# Altium footprint library ACTION标准库.pcblib: 504 footprints (part 5 of 32)
Each footprint in its own frame and in the unit in brackets; x right, y up, seen from the top. Pads: shape width x height; smd on the part's side, far side on the other; paste and mask are expansions set on the pad; w line width, h text height; cw(c..) or ccw(c..) is an arc to the next point about the centre after c.
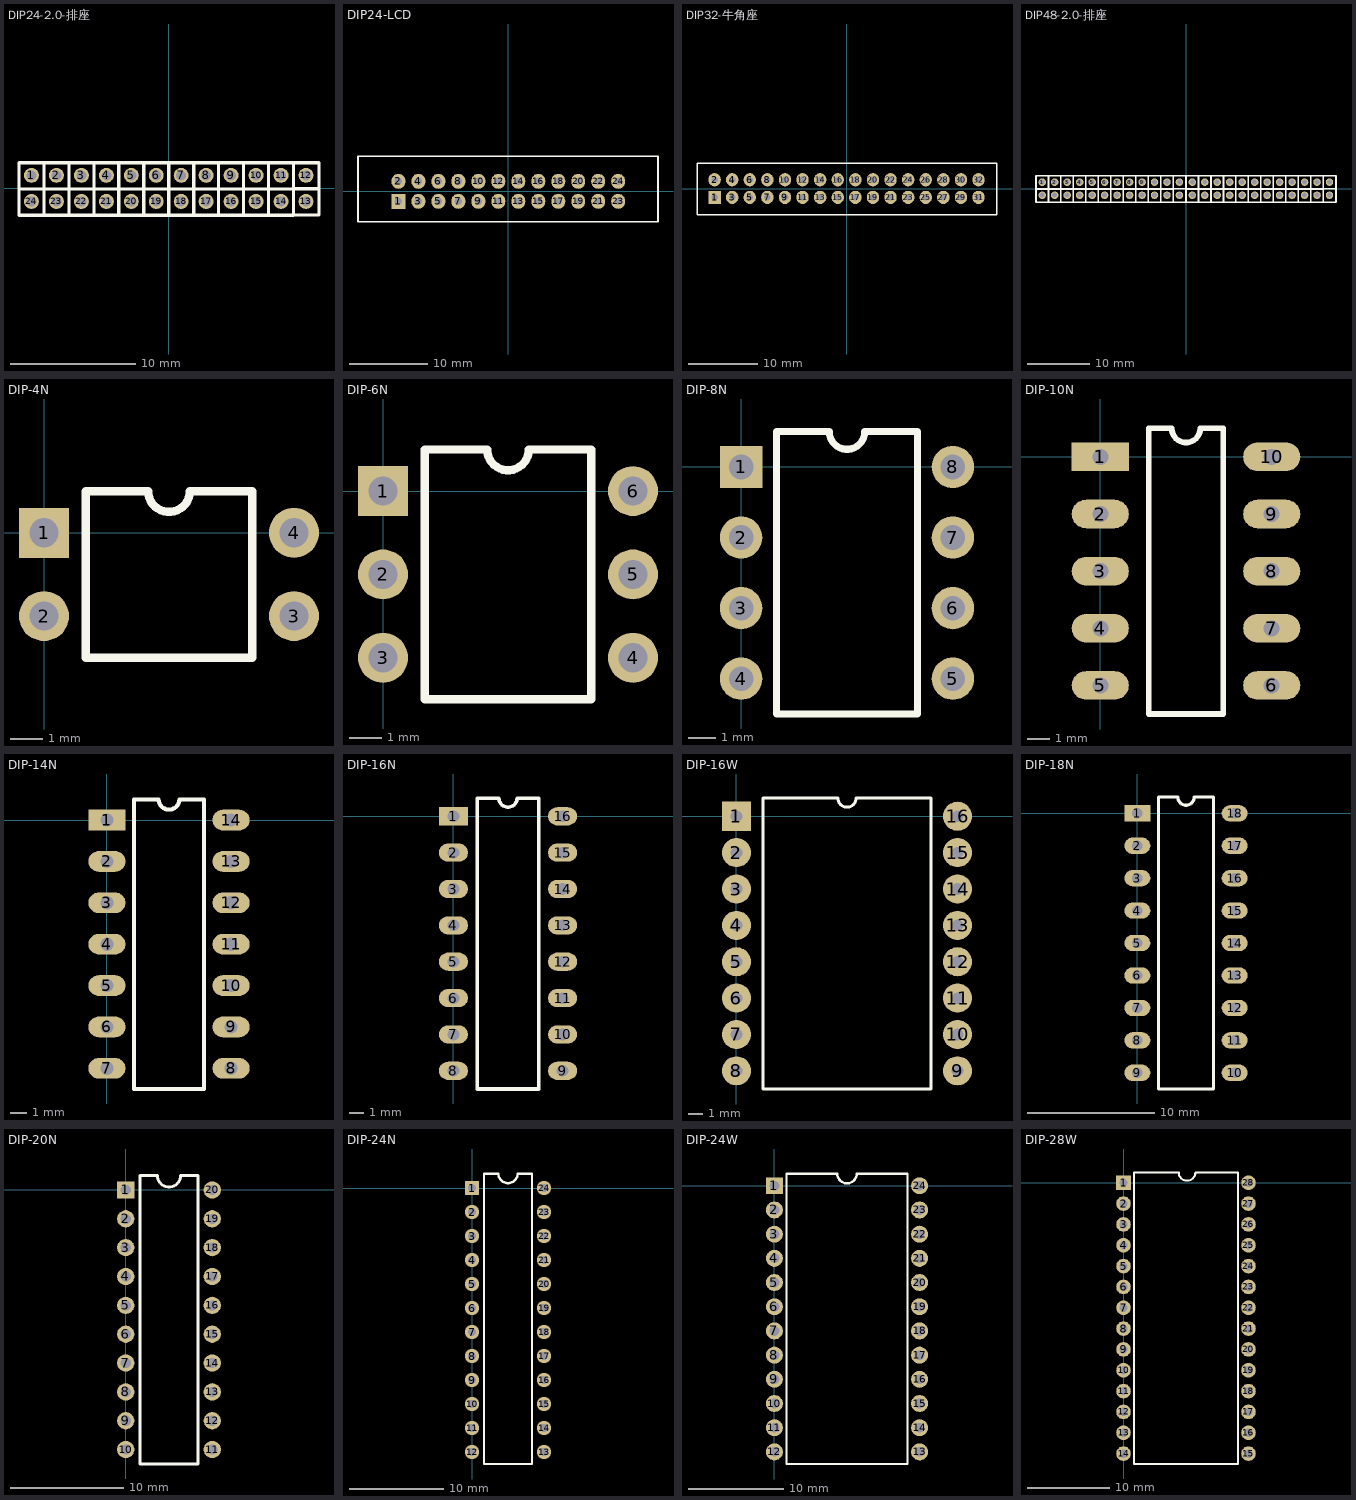
[diagram p4: the footprints below, top view; thin cyan lines are the x and y axes]

## DIP24-2.0-排座 [mm]
pads (24):
  round 1.2 hole 0.8: 1(-11,1.05) 2(-9,1.05) 3(-7,1.05) 4(-5,1.05) 5(-3,1.05) 6(-1,1.05) 7(1,1.05) 8(3,1.05) 9(5,1.05) 10(7,1.05) 11(9,1.05) 12(11,1.05) 13(11,-1.05) 14(9,-1.05) 15(7,-1.05) 16(5,-1.05) 17(3,-1.05) 18(1,-1.05) 19(-1,-1.05) 20(-3,-1.05) 21(-5,-1.05) 22(-7,-1.05) 23(-9,-1.05) 24(-11,-1.05)
Top Overlay:
  lines w0.254: -10.12,2.05 12.042,2.05 12.042,-2.142 9.96,-2.142 ; -10,-2.05 -10,-0.05 ; -10,0.05 -10,2.05 ; -8,-2.05 -8,-0.05 ; -8,0.05 -8,2.05 ; -6,-2.05 -6,-0.05 ; -6,0.05 -6,2.05 ; -4,-2.05 -4,-0.05 ; -4,0.05 -4,2.05 ; -2,-2.05 -2,-0.05 ; -2,0.05 -2,2.05 ; 0,-2.05 0,-0.05 ; 0,0.05 0,2.05 ; 2,-2.05 2,-0.05 ; 2,0.05 2,2.05 ; 4,-2.05 4,-0.05 ; 4,0.05 4,2.05 ; 6,-2.05 6,-0.05 ; 6,0.05 6,2.05 ; 8,-2.05 8,-0.05 ; 8,0.05 8,2.05 ; 9.985,-0.034 11.966,-0.034 ; 10,-2.15 -12,-2.15 -12,-0.05 ; 10,-2.05 10,-0.05 ; 10.007,0.05 10.007,2.05 -12,2.05 -12,-0.05 ; -12,-0.05 10,-0.05 ; -12,-0.05 10,-0.05

## DIP24-LCD [mil]
pads (24):
  rect 70x75 hole 38: 1(-550,-50)
  oval 70x75 hole 38: 2(-550,50) 3(-450,-50) 4(-450,50) 5(-350,-50) 6(-350,50) 7(-250,-50) 8(-250,50) 9(-150,-50) 10(-150,50) 11(-50,-50) 12(-50,50) 13(50,-50) 14(50,50) 15(150,-50) 16(150,50) 17(250,-50) 18(250,50) 19(350,-50) 20(350,50) 21(450,-50) 22(450,50) 23(550,-50) 24(550,50)
Top Overlay:
  lines w7.87: -752,-153 749,-153 749,176 -752,176 -752,-153

## DIP32-牛角座 [mil]
pads (32):
  rect 70x75 hole 38: 1(-750,-50)
  oval 70x75 hole 38: 2(-750,50) 3(-650,-50) 4(-650,50) 5(-550,-50) 6(-550,50) 7(-450,-50) 8(-450,50) 9(-350,-50) 10(-350,50) 11(-250,-50) 12(-250,50) 13(-150,-50) 14(-150,50) 15(-50,-50) 16(-50,50) 17(50,-50) 18(50,50) 19(150,-50) 20(150,50) 21(250,-50) 22(250,50) 23(350,-50) 24(350,50) 25(450,-50) 26(450,50) 27(550,-50) 28(550,50) 29(650,-50) 30(650,50) 31(750,-50) 32(750,50)
Top Overlay:
  lines w7.87: -850,-150 855,-150 855,145 -850,145 -850,-150

## DIP48-2.0-排座 [mm]
pads (48):
  round 1.2 hole 0.8: 1(-23.063,1.092) 2(-21.063,1.092) 3(-19.063,1.092) 4(-17.063,1.092) 5(-15.063,1.092) 6(-13.063,1.092) 7(-11.063,1.092) 8(-9.063,1.092) 9(-7.063,1.092) 10(-5.063,1.092) 11(-3.063,1.092) 12(-1.063,1.092) 13(0.991,1.092) 14(2.991,1.092) 15(4.991,1.092) 16(6.991,1.092) 17(8.991,1.092) 18(10.991,1.092) 19(12.991,1.092) 20(14.991,1.092) 21(16.991,1.092) 22(18.991,1.092) 23(20.991,1.092) 24(22.991,1.092) 25(22.991,-1.008) 26(20.991,-1.008) 27(18.991,-1.008) 28(16.991,-1.008) 29(14.991,-1.008) 30(12.991,-1.008) 31(10.991,-1.008) 32(8.991,-1.008) 33(6.991,-1.008) 34(4.991,-1.008) 35(2.991,-1.008) 36(0.991,-1.008) 37(-1.063,-1.008) 38(-3.063,-1.008) 39(-5.063,-1.008) 40(-7.063,-1.008) 41(-9.063,-1.008) 42(-11.063,-1.008) 43(-13.063,-1.008) 44(-15.063,-1.008) 45(-17.063,-1.008) 46(-19.063,-1.008) 47(-21.063,-1.008) 48(-23.063,-1.008)
Top Overlay:
  lines w0.254: -22.184,2.092 -0.021,2.092 -0.021,-2.1 -2.104,-2.1 ; -22.063,-2.008 -22.063,-0.008 ; -22.063,0.092 -22.063,2.092 ; -20.063,-2.008 -20.063,-0.008 ; -20.063,0.092 -20.063,2.092 ; -18.063,-2.008 -18.063,-0.008 ; -18.063,0.092 -18.063,2.092 ; -16.063,-2.008 -16.063,-0.008 ; -16.063,0.092 -16.063,2.092 ; -14.063,-2.008 -14.063,-0.008 ; -14.063,0.092 -14.063,2.092 ; -12.063,-2.008 -12.063,-0.008 ; -12.063,0.092 -12.063,2.092 ; -10.063,-2.008 -10.063,-0.008 ; -10.063,0.092 -10.063,2.092 ; -8.063,-2.008 -8.063,-0.008 ; -8.063,0.092 -8.063,2.092 ; -6.063,-2.008 -6.063,-0.008 ; -6.063,0.092 -6.063,2.092 ; -4.063,-2.008 -4.063,-0.008 ; -4.063,0.092 -4.063,2.092 ; -2.078,0.008 -0.097,0.008 ; -2.063,-2.108 -24.063,-2.108 -24.063,-0.008 ; -2.063,-2.008 -2.063,-0.008 ; -2.057,0.092 -2.057,2.092 -24.063,2.092 -24.063,-0.008 ; 1.87,2.092 24.033,2.092 24.033,-2.1 21.95,-2.1 ; 1.991,-2.008 1.991,-0.008 ; 1.991,0.092 1.991,2.092 ; 3.991,-2.008 3.991,-0.008 ; 3.991,0.092 3.991,2.092 ; 5.991,-2.008 5.991,-0.008 ; 5.991,0.092 5.991,2.092 ; 7.991,-2.008 7.991,-0.008 ; 7.991,0.092 7.991,2.092 ; 9.991,-2.008 9.991,-0.008 ; 9.991,0.092 9.991,2.092 ; 11.991,-2.008 11.991,-0.008 ; 11.991,0.092 11.991,2.092 ; 13.991,-2.008 13.991,-0.008 ; 13.991,0.092 13.991,2.092 ; 15.991,-2.008 15.991,-0.008 ; 15.991,0.092 15.991,2.092 ; 17.991,-2.008 17.991,-0.008 ; 17.991,0.092 17.991,2.092 ; 19.991,-2.008 19.991,-0.008 ; 19.991,0.092 19.991,2.092 ; 21.976,0.008 23.957,0.008 ; 21.991,-2.108 -0.009,-2.108 -0.009,-0.008 ; 21.991,-2.008 21.991,-0.008 ; 21.997,0.092 21.997,2.092 -0.009,2.092 -0.009,-0.008 ; -24.063,-0.008 -2.063,-0.008 ; -24.063,-0.008 -2.063,-0.008 ; -0.009,-0.008 21.991,-0.008 ; -0.009,-0.008 21.991,-0.008

## DIP-4N [mil]
pads (4):
  rect 60x60 hole 35: 1(0,0)
  round 60 hole 35: 2(0,-100) 3(300,-100) 4(300,0)
Top Overlay:
  lines w10: 50,-150 250,-150 250,50 175,50 cw(c150,50) 125,50 50,50 50,-150
3D body "DIP4.STEP": height 169.69, standoff -129.13, extent -13.48,-160.05 301.48,58.06

## DIP-6N [mil]
pads (6):
  rect 60x60 hole 35: 1(0,0)
  round 60 hole 35: 2(0,-100) 3(0,-200) 4(300,-200) 5(300,-100) 6(300,0)
Top Overlay:
  lines w10: 50,-250 250,-250 250,50 175,50 cw(c150,50) 125,50 50,50 50,-250
3D body "DIP6.STEP": height 169.69, standoff -129.13, extent -12.48,-260.05 302.48,58.06

## DIP-8N [mil]
pads (8):
  rect 60x60 hole 35: 1(0,0)
  round 60 hole 35: 2(0,-100) 3(0,-200) 4(0,-300) 5(300,-300) 6(300,-200) 7(300,-100) 8(300,0)
Top Overlay:
  lines w10: 50,-350 250,-350 250,50 175,50 cw(c150,50) 125,50 50,50 50,-350
3D body "DIP8.STEP": height 177.17, standoff -137.8, extent -1.76,-364.6 303.77,60.6

## DIP-10N [mil]
pads (10):
  rect 100x50 hole 28: 1(0,0)
  oval 100x50 hole 28: 2(0,-100) 3(0,-200) 4(0,-300) 5(0,-400) 6(300,-400) 7(300,-300) 8(300,-200) 9(300,-100) 10(300,0)
Top Overlay:
  lines w10: 85,-450 215,-450 215,50 175,50 cw(c150,50) 125,50 85,50 85,-450

## DIP-14N [mil]
pads (14):
  rect 90x50 hole 32: 1(0,0)
  oval 90x50 hole 32: 2(0,-100) 3(0,-200) 4(0,-300) 5(0,-400) 6(0,-500) 7(0,-600) 8(300,-600) 9(300,-500) 10(300,-400) 11(300,-300) 12(300,-200) 13(300,-100) 14(300,0)
Top Overlay:
  lines w10: 65,-650 235,-650 235,50 175,50 cw(c150,50) 125,50 65,50 65,-650
3D body "DIP14.STEP": height 179.92, standoff -150, extent -5.93,-682.47 301.94,82.49

## DIP-16N [mil]
pads (16):
  rect 80x50 hole 32: 1(0,0)
  oval 80x50 hole 32: 2(0,-100) 3(0,-200) 4(0,-300) 5(0,-400) 6(0,-500) 7(0,-600) 8(0,-700) 9(300,-700) 10(300,-600) 11(300,-500) 12(300,-400) 13(300,-300) 14(300,-200) 15(300,-100) 16(300,0)
Top Overlay:
  lines w10: 65,-750 235,-750 235,50 175,50 cw(c150,50) 125,50 65,50 65,-750
3D body "DIP16.STEP": height 179.92, standoff -150, extent -2.93,-734.47 304.94,30.49

## DIP-16W [mm]
pads (16):
  rect 2x2 hole 0.8: 1(0,0)
  round 2 hole 0.8: 2(0,-2.5) 3(0,-5) 4(0,-7.5) 5(0,-10) 6(0,-12.5) 7(0,-15) 8(0,-17.5) 9(15.2,-17.5) 10(15.2,-15) 11(15.2,-12.5) 12(15.2,-10) 13(15.2,-7.5) 14(15.2,-5) 15(15.2,-2.5) 16(15.2,0)
Top Overlay:
  lines w0.2: 1.835,-18.75 1.835,1.25 6.975,1.25 ccw(c7.6,1.25) 8.225,1.25 13.365,1.25 13.365,-18.75 1.835,-18.75

## DIP-18N [mil]
pads (18):
  rect 80x50 hole 32: 1(0,0)
  oval 80x50 hole 32: 2(0,-100) 3(0,-200) 4(0,-300) 5(0,-400) 6(0,-500) 7(0,-600) 8(0,-700) 9(0,-800) 10(300,-800) 11(300,-700) 12(300,-600) 13(300,-500) 14(300,-400) 15(300,-300) 16(300,-200) 17(300,-100) 18(300,0)
Top Overlay:
  lines w10: 65,-850 235,-850 235,50 175,50 cw(c150,50) 125,50 65,50 65,-850
3D body "DIP18.STEP": height 179.92, standoff -150, extent -10.94,-855.47 296.93,59.49

## DIP-20N [mil]
pads (20):
  rect 60x60 hole 35: 1(0,0)
  round 60 hole 35: 2(0,-100) 3(0,-200) 4(0,-300) 5(0,-400) 6(0,-500) 7(0,-600) 8(0,-700) 9(0,-800) 10(0,-900) 11(300,-900) 12(300,-800) 13(300,-700) 14(300,-600) 15(300,-500) 16(300,-400) 17(300,-300) 18(300,-200) 19(300,-100) 20(300,0)
Top Overlay:
  lines w10: 50,-950 250,-950 250,50 190,50 cw(c150,50) 110,50 50,50 50,-950
3D body "DIP-20pin.STEP": height 165, standoff -80, extent -10.99,-957.49 299,57.51

## DIP-24N [mil]
pads (24):
  rect 60x60 hole 35: 1(0,0)
  round 60 hole 35: 2(0,-100) 3(0,-200) 4(0,-300) 5(0,-400) 6(0,-500) 7(0,-600) 8(0,-700) 9(0,-800) 10(0,-900) 11(0,-1000) 12(0,-1100) 13(300,-1100) 14(300,-1000) 15(300,-900) 16(300,-800) 17(300,-700) 18(300,-600) 19(300,-500) 20(300,-400) 21(300,-300) 22(300,-200) 23(300,-100) 24(300,0)
Top Overlay:
  lines w10: 50,-1150 250,-1150 250,60 190,60 cw(c150,60) 110,60 50,60 50,-1150
3D body "DIP24.STEP": height 179.92, standoff -150, extent -5.94,-1183.47 301.94,81.49

## DIP-24W [mil]
pads (24):
  rect 70x70 hole 40: 1(0,0)
  round 70 hole 40: 2(0,-100) 3(0,-200) 4(0,-300) 5(0,-400) 6(0,-500) 7(0,-600) 8(0,-700) 9(0,-800) 10(0,-900) 11(0,-1000) 12(0,-1100) 13(600,-1100) 14(600,-1000) 15(600,-900) 16(600,-800) 17(600,-700) 18(600,-600) 19(600,-500) 20(600,-400) 21(600,-300) 22(600,-200) 23(600,-100) 24(600,0)
Top Overlay:
  lines w10: 50,-1150 550,-1150 550,50 340,50 cw(c300,50) 260,50 50,50 50,-1150
3D body "DIP24-W.STEP": height 200.39, standoff -150, extent 2.07,-1185.03 609.94,85.05

## DIP-28W [mil]
pads (28):
  rect 70x70 hole 40: 1(0,0)
  round 70 hole 40: 2(0,-100) 3(0,-200) 4(0,-300) 5(0,-400) 6(0,-500) 7(0,-600) 8(0,-700) 9(0,-800) 10(0,-900) 11(0,-1000) 12(0,-1100) 13(0,-1200) 14(0,-1300) 15(600,-1300) 16(600,-1200) 17(600,-1100) 18(600,-1000) 19(600,-900) 20(600,-800) 21(600,-700) 22(600,-600) 23(600,-500) 24(600,-400) 25(600,-300) 26(600,-200) 27(600,-100) 28(600,0)
Top Overlay:
  lines w10: 50,-1350 50,50 265,50 ccw(c305,50) 345,50 550,50 550,-1350 50,-1350
3D body "DIP28-W.STEP": height 200.39, standoff -150, extent -3.94,-1385.04 603.94,85.04